# Altium footprint library cool_library.PcbLib: 1182 footprints (part 23 of 75)
Each footprint in its own frame and in the unit in brackets; x right, y up, seen from the top. Pads: shape width x height; smd on the part's side, far side on the other; paste and mask are expansions set on the pad; w line width, h text height; cw(c..) or ccw(c..) is an arc to the next point about the centre after c.
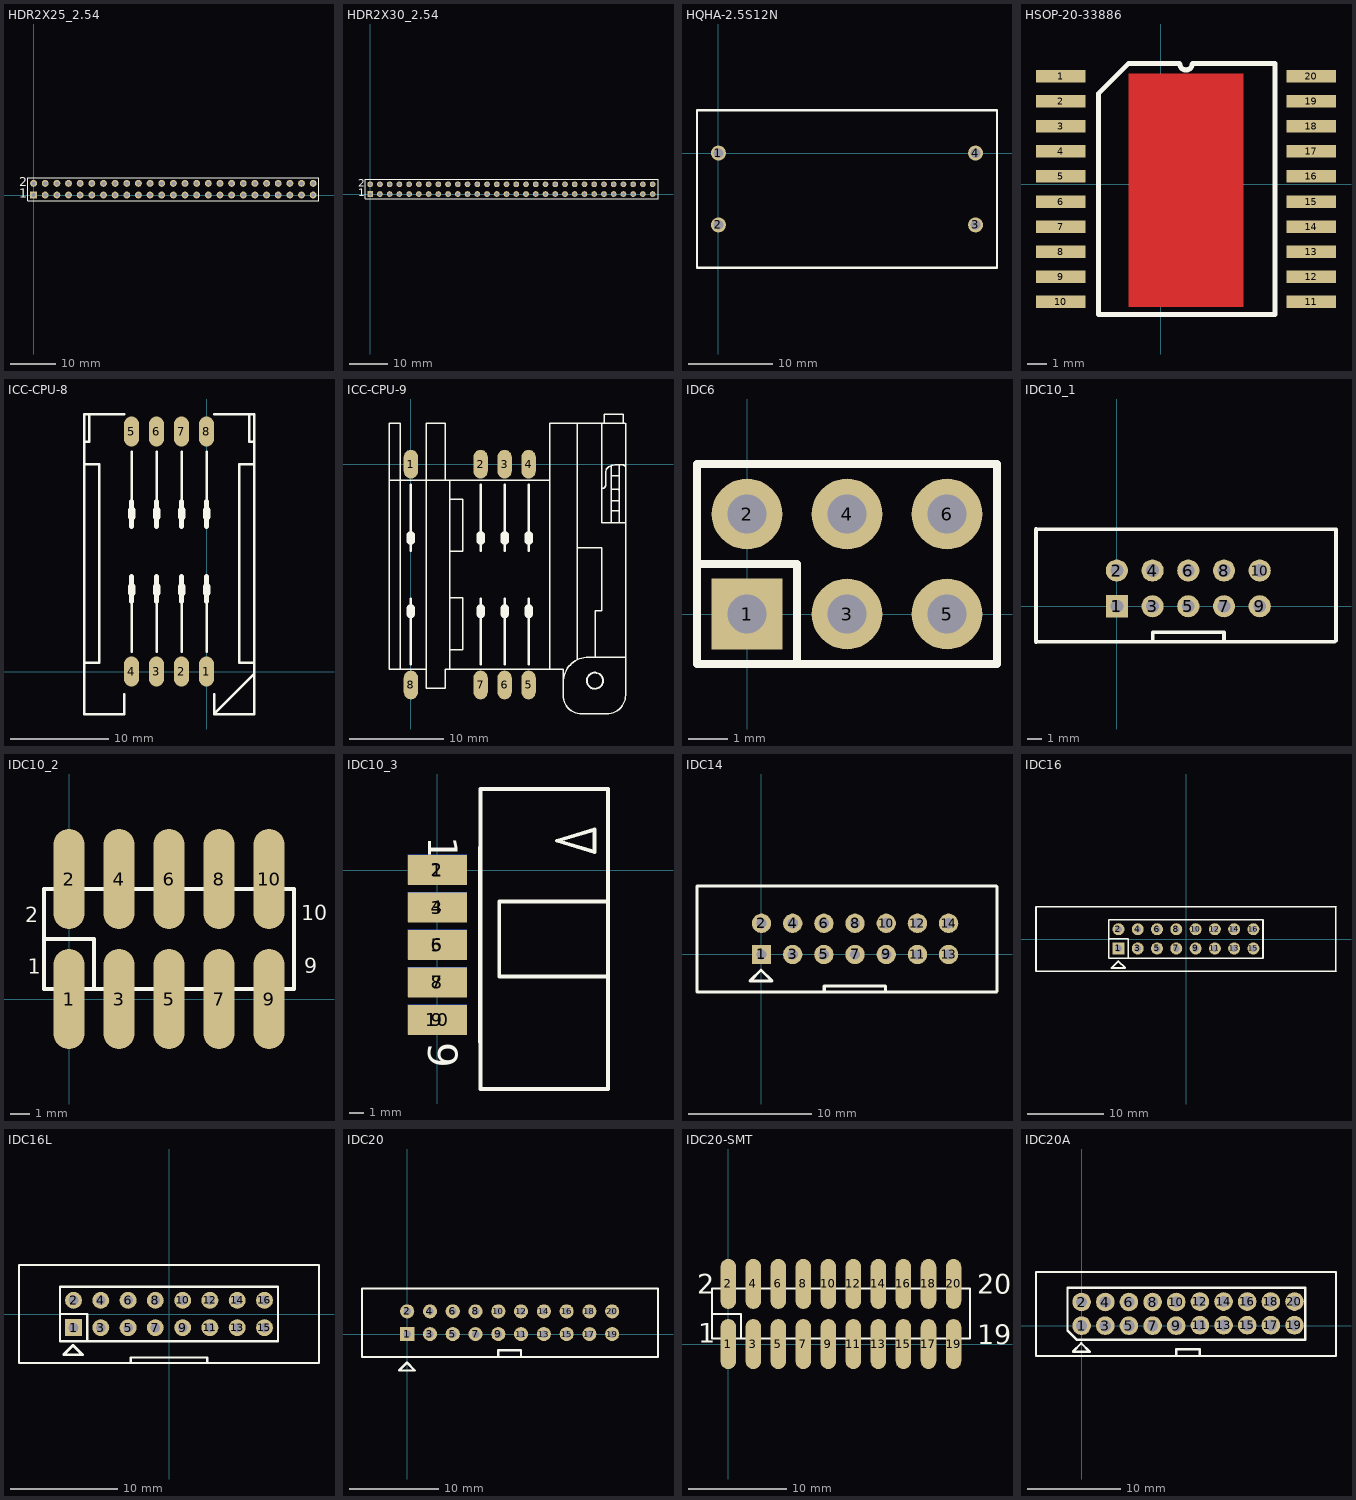
[diagram p22: the footprints below, top view; thin cyan lines are the x and y axes]

## HDR2X25_2.54 [mm]
pads (50):
  rect 1.5x1.5 hole 0.9: 1(0,0)
  round 1.5 hole 0.9: 2(0,2.54) 3(2.54,0) 4(2.54,2.54) 5(5.08,0) 6(5.08,2.54) 7(7.62,0) 8(7.62,2.54) 9(10.16,0) 10(10.16,2.54) 11(12.7,0) 12(12.7,2.54) 13(15.24,0) 14(15.24,2.54) 15(17.78,0) 16(17.78,2.54) 17(20.32,0) 18(20.32,2.54) 19(22.86,0) 20(22.86,2.54) 21(25.4,0) 22(25.4,2.54) 23(27.94,0) 24(27.94,2.54) 25(30.48,0) 26(30.48,2.54) 27(33.02,0) 28(33.02,2.54) 29(35.56,0) 30(35.56,2.54) 31(38.1,0) 32(38.1,2.54) 33(40.64,0) 34(40.64,2.54) 35(43.18,0) 36(43.18,2.54) 37(45.72,0) 38(45.72,2.54) 39(48.26,0) 40(48.26,2.54) 41(50.8,0) 42(50.8,2.54) 43(53.34,0) 44(53.34,2.54) 45(55.88,0) 46(55.88,2.54) 47(58.42,0) 48(58.42,2.54) 49(60.96,0) 50(60.96,2.54)
Top Overlay:
  lines w0.2: -1.27,-1.27 62.23,-1.27 62.23,3.81 -1.27,3.81 -1.27,-1.27
  text "2" at -3.175,1.905 h2
  text "1" at -3.175,-0.635 h2

## HDR2X30_2.54 [mm]
pads (60):
  rect 1.5x1.5 hole 0.9: 1(0,0)
  round 1.5 hole 0.9: 2(0,2.54) 3(2.54,0) 4(2.54,2.54) 5(5.08,0) 6(5.08,2.54) 7(7.62,0) 8(7.62,2.54) 9(10.16,0) 10(10.16,2.54) 11(12.7,0) 12(12.7,2.54) 13(15.24,0) 14(15.24,2.54) 15(17.78,0) 16(17.78,2.54) 17(20.32,0) 18(20.32,2.54) 19(22.86,0) 20(22.86,2.54) 21(25.4,0) 22(25.4,2.54) 23(27.94,0) 24(27.94,2.54) 25(30.48,0) 26(30.48,2.54) 27(33.02,0) 28(33.02,2.54) 29(35.56,0) 30(35.56,2.54) 31(38.1,0) 32(38.1,2.54) 33(40.64,0) 34(40.64,2.54) 35(43.18,0) 36(43.18,2.54) 37(45.72,0) 38(45.72,2.54) 39(48.26,0) 40(48.26,2.54) 41(50.8,0) 42(50.8,2.54) 43(53.34,0) 44(53.34,2.54) 45(55.88,0) 46(55.88,2.54) 47(58.42,0) 48(58.42,2.54) 49(60.96,0) 50(60.96,2.54) 51(63.5,0) 52(63.5,2.54) 53(66.04,0) 54(66.04,2.54) 55(68.58,0) 56(68.58,2.54) 57(71.12,0) 58(71.12,2.54) 59(73.66,0) 60(73.66,2.54)
Top Overlay:
  lines w0.2: -1.27,-1.27 75.06,-1.27 75.06,3.81 -1.27,3.81 -1.27,-1.27
  text "1" at -3.175,-0.635 h2
  text "2" at -3.175,1.905 h2
Bottom Overlay:
  text "1" at -55.88,-0.508 h1.27

## HQHA-2.5S12N [mil]
pads (4):
  round 70 hole 45: 1(0,0) 2(0,-335) 3(1200,-335) 4(1200,0)
Top Overlay:
  lines w10: -100,-535 1300,-535 1300,200 -100,200 -100,-535

## HSOP-20-33886 [mm]
pads (20):
  rect 2.5x0.635 smd: 1(-5.08,5.465) 2(-5.08,4.195) 3(-5.08,2.925) 4(-5.08,1.655) 5(-5.08,0.385) 6(-5.08,-0.885) 7(-5.08,-2.155) 8(-5.08,-3.425) 9(-5.08,-4.695) 10(-5.08,-5.965) 11(7.62,-5.965) 12(7.62,-4.695) 13(7.62,-3.425) 14(7.62,-2.155) 15(7.62,-0.885) 16(7.62,0.385) 17(7.62,1.655) 18(7.62,2.925) 19(7.62,4.195) 20(7.62,5.465)
Top Layer:
  rectangle: -1.651,-6.219 4.191,5.592
Top Overlay:
  lines w0.254: -3.175,-6.6 -3.175,4.576 -1.651,6.1 0.953,6.1 ccw(c1.27,6.1) 1.587,6.1 5.779,6.1 5.779,-6.6 -3.175,-6.6

## ICC-CPU-8 [mil]
pads (8):
  oval 60x120 smd: 1(0,0) 2(-100,0) 3(-200,0) 4(-300,0) 5(-300,960) 6(-200,960) 7(-100,960) 8(0,960)
Top Overlay:
  lines w10: -490,35 -430,35 -430,830 -490,830 ; -490,920 -470,920 -470,1030 ; -330,-90 -330,-170 -490,-170 -490,1030 -330,1030 ; -300,80 -300,380 ; -300,580 -300,880 ; -200,80 -200,380 ; -200,580 -200,880 ; -100,80 -100,380 ; -100,580 -100,880 ; 0,80 0,380 ; 0,580 0,880 ; 30,-90 30,-170 ; 30,1030 190,1030 190,-170 30,-170 ; 170,1030 170,920 190,920 ; 190,-10 30,-170 ; 190,35 130,35 130,830 190,830
  lines w20: -300,280 -300,380 ; -300,580 -300,680 ; -200,280 -200,380 ; -200,580 -200,680 ; -100,280 -100,380 ; -100,580 -100,680 ; 0,280 0,380 ; 0,580 0,680
  lines w30: -300,315 -300,340 ; -300,620 -300,645 ; -200,315 -200,340 ; -200,620 -200,645 ; -100,315 -100,340 ; -100,620 -100,645 ; 0,315 0,340 ; 0,620 0,645

## ICC-CPU-9 [mil]
height 7.87
pads (8):
  oval 60x120 smd: 1(0,0) 2(290,0) 3(390,0) 4(490,0) 5(490,-920) 6(390,-920) 7(290,-920) 8(0,-920)
Top Overlay:
  circle w8: c766.74,-902.08 r33.6
  lines w6: -90.02,-66.3 142.71,-66.3 ; 63.97,-853.78 -45.03,-853.78 ; 142.49,-854.08 cw(c141.96,-854.61) 142.71,-854.61 ; 160.7,-853.78 ccw(c160.7,-851.39) 162.39,-853.08 ; 162.08,-66.3 577.39,-66.3 ; 162.39,-854.08 162.39,-136.99 162.39,-66.3 142.71,-66.3 ; 162.39,-773.92 215.49,-773.92 215.49,-556.92 162.39,-556.92 ; 162.39,-363.08 215.49,-363.08 215.49,-146.08 162.39,-146.08 ; 633.9,-927.08 633.9,-909.54 cw(c739.2,-909.54) 664.74,-835.08 668.81,-831 cw(c730.74,-892.93) 730.74,-805.36 741.74,-805.36 891.99,-805.36 cw(c891.99,-807.83) 893.74,-806.08 ccw(c893.02,-806.08) 893.02,-805.35 ; 692.42,-813.8 692.42,-420.71 692.42,169.84 ; 692.42,-349.16 794.79,-349.16 794.79,-610.16 768.79,-610.16 768.79,-805.36 ; 794.79,-243.54 794.79,169.84 ; 794.79,-101.08 797.08,-101.08 ccw(c797.08,-87.42) 806.74,-97.08 ccw(c794.67,-85.01) 811.74,-85.01 811.74,-32.98 cw(c835.64,-32.98) 818.74,-16.08 cw(c850.12,-47.46) 850.12,-3.08 881.67,-3.08 cw(c881.67,-20.15) 893.74,-8.08 ; 794.87,-243.54 893.74,-243.54 ; 805,169.84 805,209 883.74,209 883.74,169.84 ; 835,-243.54 835,-6 ; 835,-195 867,-195 ; 835,-152 864.59,-152 ccw(c864.59,-148.59) 867,-151 ; 835,-105 862.17,-105 cw(c862.17,-111.83) 867,-107 ; 835,-48 864.59,-48 ccw(c864.59,-44.59) 867,-47 ; 838.87,-243.54 ccw(c838.57,-243.24) 839,-243.24 ; 867,-243.54 867,-3.08 ; 893.74,169.84 794.79,169.84 ; 894.23,-962 cw(c815.49,-962) 815.49,-1040.74 cw(c815.3,-1040.55) 815.3,-1040.82 712.64,-1040.82 cw(c712.64,-962.08) 633.9,-962.08 633.9,-855.2 ccw(c630.48,-858.62) 630.48,-853.78 577.39,-853.78 ; 894.23,-961 894.23,169.84 ; -45.03,-853.78 -90.02,-853.78 -90.02,169.84 -45.03,169.84 -45.03,-853.78 ; 142.71,-854.61 142.71,-865.34 142.71,-932.52 63.97,-932.52 63.97,169.84 142.71,169.84 142.71,-49.08 142.71,-66.3 ; 142.71,-854.61 142.71,-853.78 577.39,-853.78 ; 577.39,-853.78 577.39,-66.38 577.39,169.84 791.79,169.84 794.79,169.84
  lines w10: 0,-834.02 0,-560 0,-660 ; 0,-260 0,-360 0,-85.98 ; 290,-834.02 290,-560 290,-660 ; 390,-834.02 390,-560 390,-660 ; 390,-260 390,-360 390,-85.98 ; 490,-834.02 490,-560 490,-660 ; 490,-260 490,-360 490,-85.98 ; 290,-360 290,-260 290,-360 ; 290,-360 290,-85.98 290,-360
  lines w35: 0,-625 0,-600 ; 0,-320 0,-295 ; 290,-625 290,-600 ; 390,-625 390,-600 ; 390,-320 390,-295 ; 490,-625 490,-600 ; 490,-320 490,-295 ; 290,-320 290,-295 290,-320

## IDC6 [mm]
pads (6):
  rect 1.8x1.8 hole 1: 1(0,0)
  round 1.8 hole 1: 2(0,2.54) 3(2.54,0) 4(2.54,2.54) 5(5.08,0) 6(5.08,2.54)
Top Overlay:
  lines w0.203: -1.27,1.27 1.27,1.27 1.27,-1.27 ; -1.27,-1.27 -1.27,3.81 6.35,3.81 6.35,-1.27 -1.27,-1.27

## IDC10_1 [mil]
pads (10):
  rect 62x62 hole 36: 1(0,0)
  round 62 hole 36: 2(0,100) 3(100,0) 4(100,100) 5(200,0) 6(200,100) 7(300,0) 8(300,100) 9(400,0) 10(400,100)
Top Overlay:
  lines w10: -226.4,-99.49 609.98,-99.49 ; -226.4,215.47 613.6,215.47 613.6,-95.87 ; 100,-99.49 100,-73 300,-73 300,-99.49
  lines w12: -226.4,-99.49 -226.4,215.47

## IDC10_2 [mil]
pads (10):
  oval 62x200 smd: 1(0,0) 2(0,240) 3(100,0) 4(100,240) 5(200,0) 6(200,240) 7(300,0) 8(300,240) 9(400,0) 10(400,240)
Top Overlay:
  lines w8: -50,120 50,120 50,20 ; -50,20 -50,220 450,220 450,20 -50,20
  text "10" at 464,158 h30
  text "9" at 470,52 h30
  text "2" at -88,154 h30
  text "1" at -83,51 h30

## IDC10_3 [mm]
pads (10):
  rect 4x2 smd: 1(0,0) 3(0,-2.54) 5(0,-5.08) 7(0,-7.62) 9(0,-10.16)
  rect 4x2 smd far side: 2(0,0.025) 4(0,-2.515) 6(0,-5.055) 8(0,-7.595) 10(0,-10.135)
Top Overlay:
  lines w0.254: 2.87,-11.659 2.87,-10.643 2.87,1.549 ; 11.557,-7.214 4.191,-7.214 4.191,-2.134 11.557,-2.134 ; 2.921,-14.834 2.921,5.486 ; 2.921,-14.834 2.921,5.486 ; 2.921,-14.834 11.557,-14.834 11.557,5.486 2.921,5.486 ; 8.103,1.981 10.643,1.219 10.643,2.743 8.103,1.981
  text "1" at -0.635,2.286 h2
  text "9" at -0.635,-11.684 h2
Bottom Overlay:
  text "2" at -0.635,1.651 h2
  text "10" at -0.635,-13.335 h2

## IDC14 [mil]
pads (14):
  rect 62x62 hole 33: 1(0,0)
  round 62 hole 33: 2(0,100) 3(100,0) 4(100,100) 5(200,0) 6(200,100) 7(300,0) 8(300,100) 9(400,0) 10(400,100) 11(500,0) 12(500,100) 13(600,0) 14(600,100)
Top Overlay:
  lines w10: -206.78,219.37 753.22,219.37 755.22,217.37 755.22,-118.63 753.22,-120.63 -47.78,-120.63 -206.78,-120.63 -206.78,220 ; 201.22,-120.63 201.22,-100.63 398.22,-100.63 398.22,-120.63 ; -36.4,-84.53 33.6,-84.53 -1.4,-49.53 -36.4,-84.53

## IDC16 [mm]
pads (16):
  rect 1.575x1.575 hole 0.9: 1(-8.9,-1.25)
  round 1.575 hole 0.9: 2(-8.9,1.29) 3(-6.36,-1.25) 4(-6.36,1.29) 5(-3.82,-1.25) 6(-3.82,1.29) 7(-1.28,-1.25) 8(-1.28,1.29) 9(1.26,-1.25) 10(1.26,1.29) 11(3.8,-1.25) 12(3.8,1.29) 13(6.34,-1.25) 14(6.34,1.29) 15(8.88,-1.25) 16(8.88,1.29)
Top Overlay:
  lines w0.203: -10.17,0.02 -7.63,0.02 -7.63,-2.52 ; 19.765,-4.25 19.765,4.25 ; 19.77,-4.25 -19.77,-4.25 -19.77,4.25 19.77,4.25 ; -10.17,-2.52 -10.17,2.56 10.15,2.56 10.15,-2.52 -10.17,-2.52
  lines w0.254: -9.815,-3.798 -8.926,-2.909 -8.037,-3.798 -9.815,-3.798

## IDC16L [mil]
pads (16):
  rect 62x62 hole 35.43: 1(-350,-50)
  round 62 hole 35.43: 2(-350,50) 3(-250,-50) 4(-250,50) 5(-150,-50) 6(-150,50) 7(-50,-50) 8(-50,50) 9(50,-50) 10(50,50) 11(150,-50) 12(150,50) 13(250,-50) 14(250,50) 15(350,-50) 16(350,50)
Top Overlay:
  lines w8: -400,0 -300,0 -300,-100 ; -140,-180 -140,-160 140,-160 140,-180 ; -550,-180 -550,180 550,180 550,-180 -550,-180 ; -400,-100 400,-100 400,100 -400,100 -400,-100
  lines w10: -386.4,-149.53 -351.4,-114.53 -316.4,-149.53 -386.4,-149.53

## IDC20 [mil]
pads (20):
  rect 62x62 hole 33: 1(0,0)
  round 62 hole 33: 2(0,100) 3(100,0) 4(100,100) 5(200,0) 6(200,100) 7(300,0) 8(300,100) 9(400,0) 10(400,100) 11(500,0) 12(500,100) 13(600,0) 14(600,100) 15(700,0) 16(700,100) 17(800,0) 18(800,100) 19(900,0) 20(900,100)
Top Overlay:
  lines w10: 400,-100 400,-71 500,-71 500,-100 ; -198.84,-100.28 -198.84,199.72 1101.16,199.72 1101.16,-100.28 -198.84,-100.28 ; -36.4,-159.53 33.6,-159.53 -1.4,-124.53 -36.4,-159.53

## IDC20-SMT [mil]
pads (20):
  oval 62x200 smd: 1(0,0) 2(0,240) 3(100,0) 4(100,240) 5(200,0) 6(200,240) 7(300,0) 8(300,240) 9(400,0) 10(400,240) 11(500,0) 12(500,240) 13(600,0) 14(600,240) 15(700,0) 16(700,240) 17(800,0) 18(800,240) 19(900,0) 20(900,240)
Top Overlay:
  lines w8: -65.01,120 50,120 50,23 ; -65.01,22 -65.01,222 966,222 966,23 -65.01,22
  text "19" at 995,0 h78.74
  text "20" at 995,200 h78.74
  text "1" at -120,5 h78.74
  text "2" at -125,200 h78.74

## IDC20A [mm]
pads (20):
  round 2 hole 1.2: 1(0,0) 2(0,2.54) 3(2.54,0) 4(2.54,2.54) 5(5.08,0) 6(5.08,2.54) 7(7.62,0) 8(7.62,2.54) 9(10.16,0) 10(10.16,2.54) 11(12.7,0.051) 12(12.7,2.591) 13(15.24,0.051) 14(15.24,2.591) 15(17.78,0.051) 16(17.78,2.591) 17(20.32,0.051) 18(20.32,2.591) 19(22.86,0.051) 20(22.86,2.591)
Top Overlay:
  lines w0.254: 10.16,-3.251 10.16,-2.515 12.7,-2.515 12.7,-3.251 ; -4.9,-3.26 27.317,-3.235 27.317,5.765 -4.9,5.74 -4.9,-3.26 ; -1.524,-0.508 -0.508,-1.524 24.028,-1.524 24.028,4.064 -1.524,4.064 -1.524,-0.508 ; -0.925,-2.782 0.853,-2.782 -0.036,-1.893 -0.925,-2.782